# Altium footprint library 我的器件.PCBLIB: 450 footprints (part 21 of 29)
Each footprint in its own frame and in the unit in brackets; x right, y up, seen from the top. Pads: shape width x height; smd on the part's side, far side on the other; paste and mask are expansions set on the pad; w line width, h text height; cw(c..) or ccw(c..) is an arc to the next point about the centre after c.
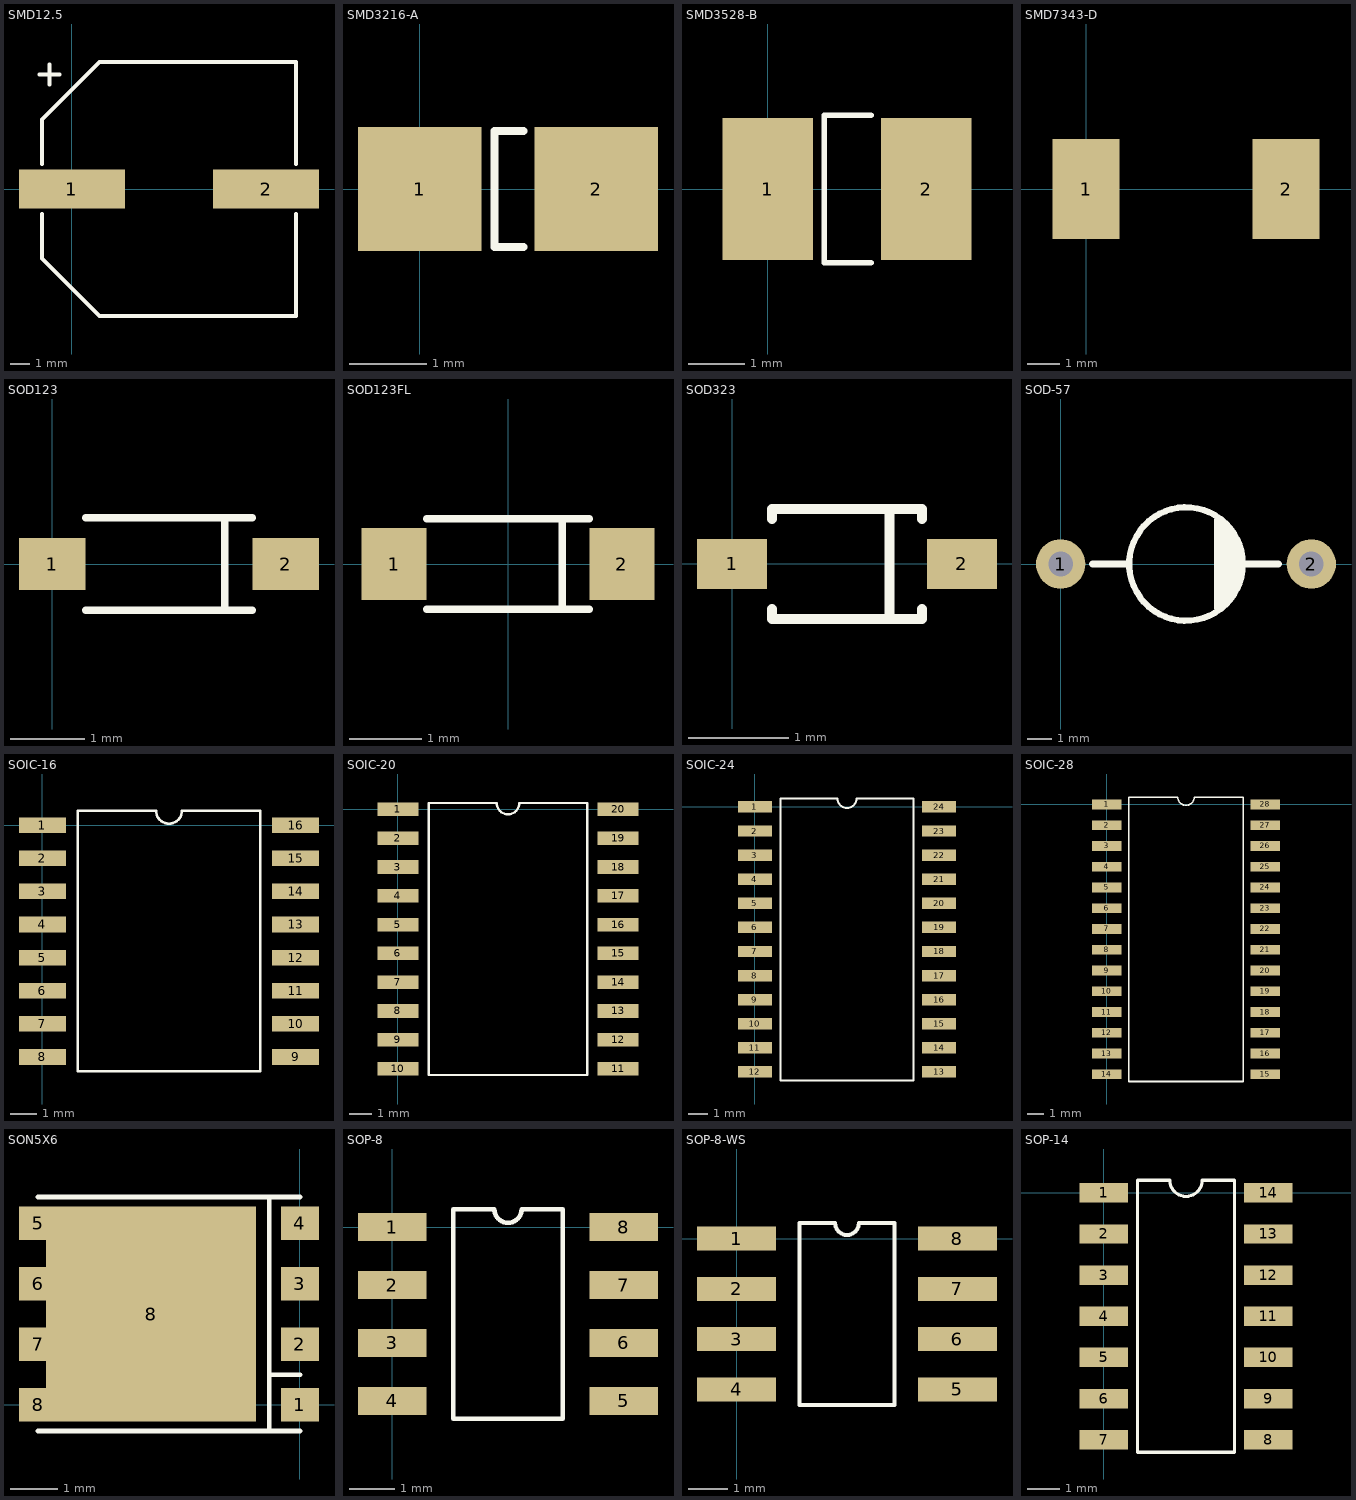
[diagram p20: the footprints below, top view; thin cyan lines are the x and y axes]

## SMD12.5 [mm]
height 13.5
pads (2):
  rect 5.4x2 smd: 1(0,0) 2(9.906,0)
Top Overlay:
  lines w0.2: -1.651,5.842 -0.635,5.842 ; -1.524,-1.27 -1.524,-3.556 1.397,-6.477 11.43,-6.477 11.43,-1.27 ; -1.524,1.27 -1.524,3.556 1.397,6.477 11.43,6.477 11.43,1.27 ; -1.143,5.334 -1.143,6.35

## SMD3216-A [mm]
pads (2):
  rect 1.6x1.6 smd: 1(0,0) 2(2.286,0)
Top Overlay:
  lines w0.1: 1.343,-0.75 0.968,-0.75 0.968,0.75 1.343,0.75
3D body: height 0.9, standoff 0, extent 2.736,-0.7 2.836,0.7
3D body: height 1.61, standoff 1.6, extent -0.357,-1 0.143,1
3D body: height 1.6, standoff 0, extent -0.457,-1 2.743,1
3D body: height 0.9, standoff 0, extent -0.55,-0.7 -0.45,0.7

## SMD3528-B [mm]
height 1.5
pads (2):
  rect 1.6x2.5 smd: 1(0,0) 2(2.8,0)
Top Overlay:
  lines w0.1: 1.825,-1.3 1,-1.3 1,1.3 1.825,1.3
3D body: height 1.2, standoff 0, extent 3.25,-1.2 3.35,1.2
3D body: height 1.2, standoff 0, extent -0.55,-1.2 -0.45,1.2
3D body: height 2, standoff 0, extent -0.45,-1.5 3.25,1.5
3D body: height 2.01, standoff 2, extent -0.305,-1.5 0.305,1.5

## SMD7343-D [mil]
height 196.85
pads (2):
  rect 80x120 smd: 1(0,0) 2(240,0)
3D body: height 62.99, standoff 0, extent -31.5,-49.21 -23.62,49.21
3D body: height 118.11, standoff 0, extent -25.67,-86.61 265.67,86.61
3D body: height 118.5, standoff 118.11, extent -7.95,-86.61 27.48,86.61
3D body: height 62.99, standoff 0, extent 263.62,-49.21 271.5,49.21

## SOD123 [mm]
pads (2):
  rect 0.9x0.7 smd: 1(0,0) 2(3.15,0)
Top Overlay:
  lines w0.1: 0.45,-0.625 2.7,-0.625 ; 0.45,0.625 2.7,0.625 ; 2.325,-0.625 2.325,0.625
3D body: height 0.3, standoff 0, extent 2.775,-0.25 3.475,0.25
3D body: height 1.31, standoff 1.3, extent 2.6,-0.8 2.8,0.8
3D body: height 0.3, standoff 0, extent -0.325,-0.25 0.375,0.25
3D body: height 1.3, standoff 0.2, extent 0.175,-0.8 2.975,0.8

## SOD123FL [mm]
pads (2):
  rect 0.9x1 smd: 1(-1.575,0) 2(1.575,0)
Top Overlay:
  lines w0.1: -1.125,-0.625 1.125,-0.625 ; -1.125,0.625 1.125,0.625 ; 0.75,-0.625 0.75,0.625
3D body: height 0.3, standoff 0, extent 1.2,-0.45 1.9,0.45
3D body: height 1.31, standoff 1.3, extent 1.025,-0.8 1.225,0.8
3D body: height 0.3, standoff 0, extent -1.9,-0.45 -1.2,0.45
3D body: height 1.3, standoff 0.2, extent -1.4,-0.8 1.4,0.8

## SOD323 [mm]
pads (2):
  rect 0.7x0.5 smd: 1(0,0) 2(2.3,0)
Top Overlay:
  lines w0.1: 0.4,-0.45 0.4,-0.55 1.9,-0.55 1.9,-0.45 ; 0.4,0.45 0.4,0.55 1.9,0.55 1.9,0.45 ; 1.575,-0.55 1.575,0.55
3D body: height 0.7, standoff 0, extent 2.15,-0.15 2.3,0.15
3D body: height 0.15, standoff 0, extent 2.3,-0.15 2.55,0.15
3D body: height 0.7, standoff 0.55, extent 1.925,-0.15 2.15,0.15
3D body: height 0.7, standoff 0.55, extent 0.15,-0.15 0.375,0.15
3D body: height 1, standoff 0.2, extent 0.3,-0.65 2,0.65
3D body: height 1.01, standoff 1, extent 1.45,-0.65 2,0.65
3D body: height 0.15, standoff 0, extent -0.25,-0.15 0,0.15
3D body: height 0.7, standoff 0, extent 0,-0.15 0.15,0.15

## SOD-57 [mm]
pads (2):
  round 2 hole 1: 1(0,0) 2(10.16,0)
Top Overlay:
  circle w0.254: c5.08,0 r2.3
  lines w0.254: 6.35,-1.778 6.35,1.778
  lines w0.3: 1.295,0 2.718,0 ; 6.629,1.626 6.604,1.6 6.604,-1.524 6.502,-1.626 6.502,-1.499 6.858,-1.143 6.858,1.321 ; 6.858,0.965 6.934,0.965 7.137,0.762 7.137,-0.965 ; 7.188,0 8.814,0

## SOIC-16 [mm] "Wide body"
height 4
pads (16):
  rect 1.8x0.6 smd: 1(0,0) 2(0,-1.27) 3(0,-2.54) 4(0,-3.81) 5(0,-5.08) 6(0,-6.35) 7(0,-7.62) 8(0,-8.89) 9(9.703,-8.89) 10(9.703,-7.62) 11(9.703,-6.35) 12(9.703,-5.08) 13(9.703,-3.81) 14(9.703,-2.54) 15(9.703,-1.27) 16(9.703,0)
Top Overlay:
  lines w0.1: 1.351,-9.445 1.351,0.555 4.351,0.555 ccw(c4.851,0.555) 4.851,0.055 ccw(c4.851,0.555) 5.351,0.555 8.351,0.555 8.351,-9.445 1.351,-9.445
3D body: height 0.2, standoff 0, extent 9.289,-0.279 10.051,0.279
3D body: height 1.3, standoff 0, extent 9.111,-0.279 9.289,0.279
3D body: height 1.3, standoff 1, extent 8.603,-0.279 9.111,0.279
3D body: height 0.2, standoff 0, extent 9.289,-1.549 10.051,-0.991
3D body: height 1.3, standoff 0, extent 9.111,-1.549 9.289,-0.991
3D body: height 1.3, standoff 1, extent 8.603,-1.549 9.111,-0.991
3D body: height 0.2, standoff 0, extent 9.289,-2.819 10.051,-2.261
3D body: height 1.3, standoff 0, extent 9.111,-2.819 9.289,-2.261
3D body: height 1.3, standoff 1, extent 8.603,-2.819 9.111,-2.261
3D body: height 0.2, standoff 0, extent 9.289,-4.089 10.051,-3.531
3D body: height 1.3, standoff 0, extent 9.111,-4.089 9.289,-3.531
3D body: height 1.3, standoff 1, extent 8.603,-4.089 9.111,-3.531
3D body: height 0.2, standoff 0, extent 9.289,-5.359 10.051,-4.801
3D body: height 1.3, standoff 0, extent 9.111,-5.359 9.289,-4.801
3D body: height 1.3, standoff 1, extent 8.603,-5.359 9.111,-4.801
3D body: height 0.2, standoff 0, extent 9.289,-6.629 10.051,-6.071
3D body: height 1.3, standoff 0, extent 9.111,-6.629 9.289,-6.071
3D body: height 1.3, standoff 1, extent 8.603,-6.629 9.111,-6.071
3D body: height 0.2, standoff 0, extent 9.289,-7.899 10.051,-7.341
3D body: height 1.3, standoff 0, extent 9.111,-7.899 9.289,-7.341
3D body: height 1.3, standoff 1, extent 8.603,-7.899 9.111,-7.341
3D body: height 0.2, standoff 0, extent 9.289,-9.169 10.051,-8.611
3D body: height 1.3, standoff 0, extent 9.111,-9.169 9.289,-8.611
3D body: height 1.3, standoff 1, extent 8.603,-9.169 9.111,-8.611
3D body: height 0.2, standoff 0, extent -0.348,-9.169 0.414,-8.611
3D body: height 1.3, standoff 0, extent 0.414,-9.169 0.592,-8.611
3D body: height 1.3, standoff 1, extent 0.592,-9.169 1.1,-8.611
3D body: height 0.2, standoff 0, extent -0.348,-7.899 0.414,-7.341
3D body: height 1.3, standoff 0, extent 0.414,-7.899 0.592,-7.341
3D body: height 1.3, standoff 1, extent 0.592,-7.899 1.1,-7.341
3D body: height 0.2, standoff 0, extent -0.348,-6.629 0.414,-6.071
3D body: height 1.3, standoff 0, extent 0.414,-6.629 0.592,-6.071
3D body: height 1.3, standoff 1, extent 0.592,-6.629 1.1,-6.071
3D body: height 0.2, standoff 0, extent -0.348,-5.359 0.414,-4.801
3D body: height 1.3, standoff 0, extent 0.414,-5.359 0.592,-4.801
3D body: height 1.3, standoff 1, extent 0.592,-5.359 1.1,-4.801
3D body: height 0.2, standoff 0, extent -0.348,-4.089 0.414,-3.531
3D body: height 1.3, standoff 0, extent 0.414,-4.089 0.592,-3.531
3D body: height 1.3, standoff 1, extent 0.592,-4.089 1.1,-3.531
3D body: height 0.2, standoff 0, extent -0.348,-2.819 0.414,-2.261
3D body: height 1.3, standoff 0, extent 0.414,-2.819 0.592,-2.261
3D body: height 1.3, standoff 1, extent 0.592,-2.819 1.1,-2.261
3D body: height 0.2, standoff 0, extent -0.348,-1.549 0.414,-0.991
3D body: height 1.3, standoff 0, extent 0.414,-1.549 0.592,-0.991
3D body: height 1.3, standoff 1, extent 0.592,-1.549 1.1,-0.991
3D body: height 2.41, standoff 0, extent 1.702,-1 2.698,-0.002
3D body: height 1.3, standoff 1, extent 0.592,-0.279 1.1,0.279
3D body: height 1.3, standoff 0, extent 0.414,-0.279 0.592,0.279
3D body: height 0.2, standoff 0, extent -0.348,-0.279 0.414,0.279
3D body: height 2.4, standoff 0.1, extent 1.101,-9.695 8.601,0.805

## SOIC-20 [mm]
pads (20):
  rect 1.8x0.6 smd: 1(0,0) 2(0,-1.27) 3(0,-2.54) 4(0,-3.81) 5(0,-5.08) 6(0,-6.35) 7(0,-7.62) 8(0,-8.89) 9(0,-10.16) 10(0,-11.43) 11(9.703,-11.43) 12(9.703,-10.16) 13(9.703,-8.89) 14(9.703,-7.62) 15(9.703,-6.35) 16(9.703,-5.08) 17(9.703,-3.81) 18(9.703,-2.54) 19(9.703,-1.27) 20(9.703,0)
Top Overlay:
  lines w0.1: 4.351,0.285 ccw(c4.851,0.285) 4.851,-0.215 ccw(c4.851,0.285) 5.351,0.285 ; 4.351,0.285 4.351,0.285 ; 4.351,0.285 1.351,0.285 1.351,-11.715 8.351,-11.715 8.351,0.285 ; 5.351,0.285 ccw(c5.351,0.285) 5.351,0.285 ; 5.351,0.285 8.351,0.285 ; 8.351,0.285 ccw(c8.351,0.285) 8.351,0.285
3D body: height 1.3, standoff 1, extent 8.603,-0.279 9.111,0.279
3D body: height 1.3, standoff 0, extent 9.111,-0.279 9.289,0.279
3D body: height 0.2, standoff 0, extent 9.289,-0.279 10.051,0.279
3D body: height 0.2, standoff 0, extent 9.289,-1.549 10.051,-0.991
3D body: height 1.3, standoff 0, extent 9.111,-1.549 9.289,-0.991
3D body: height 1.3, standoff 1, extent 8.603,-1.549 9.111,-0.991
3D body: height 0.2, standoff 0, extent 9.289,-2.819 10.051,-2.261
3D body: height 1.3, standoff 0, extent 9.111,-2.819 9.289,-2.261
3D body: height 1.3, standoff 1, extent 8.603,-2.819 9.111,-2.261
3D body: height 0.2, standoff 0, extent 9.289,-4.089 10.051,-3.531
3D body: height 1.3, standoff 0, extent 9.111,-4.089 9.289,-3.531
3D body: height 1.3, standoff 1, extent 8.603,-4.089 9.111,-3.531
3D body: height 0.2, standoff 0, extent 9.289,-5.359 10.051,-4.801
3D body: height 1.3, standoff 0, extent 9.111,-5.359 9.289,-4.801
3D body: height 1.3, standoff 1, extent 8.603,-5.359 9.111,-4.801
3D body: height 0.2, standoff 0, extent 9.289,-6.629 10.051,-6.071
3D body: height 1.3, standoff 0, extent 9.111,-6.629 9.289,-6.071
3D body: height 1.3, standoff 1, extent 8.603,-6.629 9.111,-6.071
3D body: height 0.2, standoff 0, extent 9.289,-7.899 10.051,-7.341
3D body: height 1.3, standoff 0, extent 9.111,-7.899 9.289,-7.341
3D body: height 1.3, standoff 1, extent 8.603,-7.899 9.111,-7.341
3D body: height 0.2, standoff 0, extent 9.289,-9.169 10.051,-8.611
3D body: height 1.3, standoff 0, extent 9.111,-9.169 9.289,-8.611
3D body: height 1.3, standoff 1, extent 8.603,-9.169 9.111,-8.611
3D body: height 0.2, standoff 0, extent 9.289,-10.439 10.051,-9.881
3D body: height 1.3, standoff 0, extent 9.111,-10.439 9.289,-9.881
3D body: height 1.3, standoff 1, extent 8.603,-10.439 9.111,-9.881
3D body: height 0.2, standoff 0, extent 9.289,-11.709 10.051,-11.151
3D body: height 1.3, standoff 0, extent 9.111,-11.709 9.289,-11.151
3D body: height 1.3, standoff 1, extent 8.603,-11.709 9.111,-11.151
3D body: height 1.3, standoff 1, extent 0.592,-11.709 1.1,-11.151
3D body: height 1.3, standoff 0, extent 0.414,-11.709 0.592,-11.151
3D body: height 0.2, standoff 0, extent -0.348,-11.709 0.414,-11.151
3D body: height 1.3, standoff 1, extent 0.592,-10.439 1.1,-9.881
3D body: height 1.3, standoff 0, extent 0.414,-10.439 0.592,-9.881
3D body: height 0.2, standoff 0, extent -0.348,-10.439 0.414,-9.881
3D body: height 1.3, standoff 1, extent 0.592,-9.169 1.1,-8.611
3D body: height 1.3, standoff 0, extent 0.414,-9.169 0.592,-8.611
3D body: height 0.2, standoff 0, extent -0.348,-9.169 0.414,-8.611
3D body: height 1.3, standoff 1, extent 0.592,-7.899 1.1,-7.341
3D body: height 1.3, standoff 0, extent 0.414,-7.899 0.592,-7.341
3D body: height 0.2, standoff 0, extent -0.348,-7.899 0.414,-7.341
3D body: height 1.3, standoff 1, extent 0.592,-6.629 1.1,-6.071
3D body: height 1.3, standoff 0, extent 0.414,-6.629 0.592,-6.071
3D body: height 0.2, standoff 0, extent -0.348,-6.629 0.414,-6.071
3D body: height 1.3, standoff 1, extent 0.592,-5.359 1.1,-4.801
3D body: height 1.3, standoff 0, extent 0.414,-5.359 0.592,-4.801
3D body: height 0.2, standoff 0, extent -0.348,-5.359 0.414,-4.801
3D body: height 1.3, standoff 1, extent 0.592,-4.089 1.1,-3.531
3D body: height 1.3, standoff 0, extent 0.414,-4.089 0.592,-3.531
3D body: height 0.2, standoff 0, extent -0.348,-4.089 0.414,-3.531
3D body: height 1.3, standoff 1, extent 0.592,-2.819 1.1,-2.261
3D body: height 1.3, standoff 0, extent 0.414,-2.819 0.592,-2.261
3D body: height 0.2, standoff 0, extent -0.348,-2.819 0.414,-2.261
3D body: height 1.3, standoff 1, extent 0.592,-1.549 1.1,-0.991
3D body: height 1.3, standoff 0, extent 0.414,-1.549 0.592,-0.991
3D body: height 0.2, standoff 0, extent -0.348,-1.549 0.414,-0.991
3D body: height 0.2, standoff 0, extent -0.348,-0.279 0.414,0.279
3D body: height 1.3, standoff 0, extent 0.414,-0.279 0.592,0.279
3D body: height 1.3, standoff 1, extent 0.592,-0.279 1.1,0.279
3D body: height 2.51, standoff 0, extent 1.669,-1 2.665,-0.002
3D body: height 2.5, standoff 0.2, extent 1.101,-12.115 8.601,0.685

## SOIC-24 [mm]
height 2
pads (24):
  rect 1.8x0.6 smd: 1(0,0) 2(0,-1.27) 3(0,-2.54) 4(0,-3.81) 5(0,-5.08) 6(0,-6.35) 7(0,-7.62) 8(0,-8.89) 9(0,-10.16) 10(0,-11.43) 11(0,-12.7) 12(0,-13.97) 13(9.703,-13.97) 14(9.703,-12.7) 15(9.703,-11.43) 16(9.703,-10.16) 17(9.703,-8.89) 18(9.703,-7.62) 19(9.703,-6.35) 20(9.703,-5.08) 21(9.703,-3.81) 22(9.703,-2.54) 23(9.703,-1.27) 24(9.703,0)
Top Overlay:
  lines w0.1: 1.351,-14.415 8.351,-14.415 8.351,0.445 5.351,0.445 cw(c4.851,0.445) 4.851,-0.055 cw(c4.851,0.445) 4.351,0.445 1.351,0.445 1.351,-14.415
3D body: height 1.3, standoff 1, extent 8.603,-0.279 9.111,0.279
3D body: height 1.3, standoff 0, extent 9.111,-0.279 9.289,0.279
3D body: height 0.2, standoff 0, extent 9.289,-0.279 10.051,0.279
3D body: height 1.3, standoff 1, extent 8.603,-1.549 9.111,-0.991
3D body: height 1.3, standoff 0, extent 9.111,-1.549 9.289,-0.991
3D body: height 0.2, standoff 0, extent 9.289,-1.549 10.051,-0.991
3D body: height 1.3, standoff 1, extent 8.603,-2.819 9.111,-2.261
3D body: height 1.3, standoff 0, extent 9.111,-2.819 9.289,-2.261
3D body: height 0.2, standoff 0, extent 9.289,-2.819 10.051,-2.261
3D body: height 1.3, standoff 1, extent 8.603,-4.089 9.111,-3.531
3D body: height 1.3, standoff 0, extent 9.111,-4.089 9.289,-3.531
3D body: height 0.2, standoff 0, extent 9.289,-4.089 10.051,-3.531
3D body: height 1.3, standoff 1, extent 8.603,-5.359 9.111,-4.801
3D body: height 1.3, standoff 0, extent 9.111,-5.359 9.289,-4.801
3D body: height 0.2, standoff 0, extent 9.289,-5.359 10.051,-4.801
3D body: height 1.3, standoff 1, extent 8.603,-6.629 9.111,-6.071
3D body: height 1.3, standoff 0, extent 9.111,-6.629 9.289,-6.071
3D body: height 0.2, standoff 0, extent 9.289,-6.629 10.051,-6.071
3D body: height 1.3, standoff 1, extent 8.603,-7.899 9.111,-7.341
3D body: height 1.3, standoff 0, extent 9.111,-7.899 9.289,-7.341
3D body: height 0.2, standoff 0, extent 9.289,-7.899 10.051,-7.341
3D body: height 1.3, standoff 1, extent 8.603,-9.169 9.111,-8.611
3D body: height 1.3, standoff 0, extent 9.111,-9.169 9.289,-8.611
3D body: height 0.2, standoff 0, extent 9.289,-9.169 10.051,-8.611
3D body: height 1.3, standoff 1, extent 8.603,-10.439 9.111,-9.881
3D body: height 1.3, standoff 0, extent 9.111,-10.439 9.289,-9.881
3D body: height 0.2, standoff 0, extent 9.289,-10.439 10.051,-9.881
3D body: height 1.3, standoff 1, extent 8.603,-11.709 9.111,-11.151
3D body: height 1.3, standoff 0, extent 9.111,-11.709 9.289,-11.151
3D body: height 0.2, standoff 0, extent 9.289,-11.709 10.051,-11.151
3D body: height 1.3, standoff 1, extent 8.603,-12.979 9.111,-12.421
3D body: height 1.3, standoff 0, extent 9.111,-12.979 9.289,-12.421
3D body: height 0.2, standoff 0, extent 9.289,-12.979 10.051,-12.421
3D body: height 1.3, standoff 1, extent 0.592,-0.279 1.1,0.279
3D body: height 1.3, standoff 0, extent 0.414,-0.279 0.592,0.279
3D body: height 0.2, standoff 0, extent -0.348,-0.279 0.414,0.279
3D body: height 2.4, standoff 0.1, extent 1.101,-14.785 8.601,0.815
3D body: height 2.41, standoff 0, extent 1.702,-1 2.698,-0.002
3D body: height 0.2, standoff 0, extent -0.348,-1.549 0.414,-0.991
3D body: height 1.3, standoff 0, extent 0.414,-1.549 0.592,-0.991
3D body: height 1.3, standoff 1, extent 0.592,-1.549 1.1,-0.991
3D body: height 0.2, standoff 0, extent -0.348,-2.819 0.414,-2.261
3D body: height 1.3, standoff 0, extent 0.414,-2.819 0.592,-2.261
3D body: height 1.3, standoff 1, extent 0.592,-2.819 1.1,-2.261
3D body: height 0.2, standoff 0, extent -0.348,-4.089 0.414,-3.531
3D body: height 1.3, standoff 0, extent 0.414,-4.089 0.592,-3.531
3D body: height 1.3, standoff 1, extent 0.592,-4.089 1.1,-3.531
3D body: height 0.2, standoff 0, extent -0.348,-5.359 0.414,-4.801
3D body: height 1.3, standoff 0, extent 0.414,-5.359 0.592,-4.801
3D body: height 1.3, standoff 1, extent 0.592,-5.359 1.1,-4.801
3D body: height 0.2, standoff 0, extent -0.348,-6.629 0.414,-6.071
3D body: height 1.3, standoff 0, extent 0.414,-6.629 0.592,-6.071
3D body: height 1.3, standoff 1, extent 0.592,-6.629 1.1,-6.071
3D body: height 0.2, standoff 0, extent -0.348,-7.899 0.414,-7.341
3D body: height 1.3, standoff 0, extent 0.414,-7.899 0.592,-7.341
3D body: height 1.3, standoff 1, extent 0.592,-7.899 1.1,-7.341
3D body: height 0.2, standoff 0, extent -0.348,-9.169 0.414,-8.611
3D body: height 1.3, standoff 0, extent 0.414,-9.169 0.592,-8.611
3D body: height 1.3, standoff 1, extent 0.592,-9.169 1.1,-8.611
3D body: height 0.2, standoff 0, extent -0.348,-10.439 0.414,-9.881
3D body: height 1.3, standoff 0, extent 0.414,-10.439 0.592,-9.881
3D body: height 1.3, standoff 1, extent 0.592,-10.439 1.1,-9.881
3D body: height 0.2, standoff 0, extent -0.348,-11.709 0.414,-11.151
3D body: height 1.3, standoff 0, extent 0.414,-11.709 0.592,-11.151
3D body: height 1.3, standoff 1, extent 0.592,-11.709 1.1,-11.151
3D body: height 0.2, standoff 0, extent -0.348,-12.979 0.414,-12.421
3D body: height 1.3, standoff 0, extent 0.414,-12.979 0.592,-12.421
3D body: height 1.3, standoff 1, extent 0.592,-12.979 1.1,-12.421
3D body: height 0.2, standoff 0, extent -0.348,-14.249 0.414,-13.691
3D body: height 1.3, standoff 0, extent 0.414,-14.249 0.592,-13.691
3D body: height 1.3, standoff 1, extent 0.592,-14.249 1.1,-13.691
3D body: height 0.2, standoff 0, extent 9.289,-14.249 10.051,-13.691
3D body: height 1.3, standoff 0, extent 9.111,-14.249 9.289,-13.691
3D body: height 1.3, standoff 1, extent 8.603,-14.249 9.111,-13.691

## SOIC-28 [mm]
height 2
pads (28):
  rect 1.8x0.6 smd: 1(0,0) 2(0,-1.27) 3(0,-2.54) 4(0,-3.81) 5(0,-5.08) 6(0,-6.35) 7(0,-7.62) 8(0,-8.89) 9(0,-10.16) 10(0,-11.43) 11(0,-12.7) 12(0,-13.97) 13(0,-15.24) 14(0,-16.51) 15(9.703,-16.51) 16(9.703,-15.24) 17(9.703,-13.97) 18(9.703,-12.7) 19(9.703,-11.43) 20(9.703,-10.16) 21(9.703,-8.89) 22(9.703,-7.62) 23(9.703,-6.35) 24(9.703,-5.08) 25(9.703,-3.81) 26(9.703,-2.54) 27(9.703,-1.27) 28(9.703,0)
Top Overlay:
  lines w0.1: 1.351,-16.955 1.351,0.445 4.351,0.445 ccw(c4.851,0.445) 4.851,-0.055 ccw(c4.851,0.445) 5.351,0.445 8.351,0.445 8.351,-16.955 1.351,-16.955
3D body: height 1.3, standoff 1, extent 8.603,-14.249 9.111,-13.691
3D body: height 1.3, standoff 0, extent 9.111,-14.249 9.289,-13.691
3D body: height 0.2, standoff 0, extent 9.289,-14.249 10.051,-13.691
3D body: height 1.3, standoff 1, extent 8.603,-15.519 9.111,-14.961
3D body: height 1.3, standoff 0, extent 9.111,-15.519 9.289,-14.961
3D body: height 0.2, standoff 0, extent 9.289,-15.519 10.051,-14.961
3D body: height 1.3, standoff 1, extent 8.603,-16.789 9.111,-16.231
3D body: height 1.3, standoff 0, extent 9.111,-16.789 9.289,-16.231
3D body: height 0.2, standoff 0, extent 9.289,-16.789 10.051,-16.231
3D body: height 1.3, standoff 1, extent 0.592,-16.789 1.1,-16.231
3D body: height 1.3, standoff 0, extent 0.414,-16.789 0.592,-16.231
3D body: height 0.2, standoff 0, extent -0.348,-16.789 0.414,-16.231
3D body: height 1.3, standoff 1, extent 0.592,-15.519 1.1,-14.961
3D body: height 1.3, standoff 0, extent 0.414,-15.519 0.592,-14.961
3D body: height 0.2, standoff 0, extent -0.348,-15.519 0.414,-14.961
3D body: height 1.3, standoff 1, extent 0.592,-14.249 1.1,-13.691
3D body: height 1.3, standoff 0, extent 0.414,-14.249 0.592,-13.691
3D body: height 0.2, standoff 0, extent -0.348,-14.249 0.414,-13.691
3D body: height 1.3, standoff 1, extent 0.592,-12.979 1.1,-12.421
3D body: height 1.3, standoff 0, extent 0.414,-12.979 0.592,-12.421
3D body: height 0.2, standoff 0, extent -0.348,-12.979 0.414,-12.421
3D body: height 1.3, standoff 1, extent 0.592,-11.709 1.1,-11.151
3D body: height 1.3, standoff 0, extent 0.414,-11.709 0.592,-11.151
3D body: height 0.2, standoff 0, extent -0.348,-11.709 0.414,-11.151
3D body: height 1.3, standoff 1, extent 0.592,-10.439 1.1,-9.881
3D body: height 1.3, standoff 0, extent 0.414,-10.439 0.592,-9.881
3D body: height 0.2, standoff 0, extent -0.348,-10.439 0.414,-9.881
3D body: height 1.3, standoff 1, extent 0.592,-9.169 1.1,-8.611
3D body: height 1.3, standoff 0, extent 0.414,-9.169 0.592,-8.611
3D body: height 0.2, standoff 0, extent -0.348,-9.169 0.414,-8.611
3D body: height 1.3, standoff 1, extent 0.592,-7.899 1.1,-7.341
3D body: height 1.3, standoff 0, extent 0.414,-7.899 0.592,-7.341
3D body: height 0.2, standoff 0, extent -0.348,-7.899 0.414,-7.341
3D body: height 1.3, standoff 1, extent 0.592,-6.629 1.1,-6.071
3D body: height 1.3, standoff 0, extent 0.414,-6.629 0.592,-6.071
3D body: height 0.2, standoff 0, extent -0.348,-6.629 0.414,-6.071
3D body: height 1.3, standoff 1, extent 0.592,-5.359 1.1,-4.801
3D body: height 1.3, standoff 0, extent 0.414,-5.359 0.592,-4.801
3D body: height 0.2, standoff 0, extent -0.348,-5.359 0.414,-4.801
3D body: height 1.3, standoff 1, extent 0.592,-4.089 1.1,-3.531
3D body: height 1.3, standoff 0, extent 0.414,-4.089 0.592,-3.531
3D body: height 0.2, standoff 0, extent -0.348,-4.089 0.414,-3.531
3D body: height 1.3, standoff 1, extent 0.592,-2.819 1.1,-2.261
3D body: height 1.3, standoff 0, extent 0.414,-2.819 0.592,-2.261
3D body: height 0.2, standoff 0, extent -0.348,-2.819 0.414,-2.261
3D body: height 1.3, standoff 1, extent 0.592,-1.549 1.1,-0.991
3D body: height 1.3, standoff 0, extent 0.414,-1.549 0.592,-0.991
3D body: height 0.2, standoff 0, extent -0.348,-1.549 0.414,-0.991
3D body: height 2.41, standoff 0, extent 1.702,-1 2.698,-0.002
3D body: height 2.4, standoff 0.1, extent 1.1,-17.3 8.601,0.805
3D body: height 0.2, standoff 0, extent -0.348,-0.279 0.414,0.279
3D body: height 1.3, standoff 0, extent 0.414,-0.279 0.592,0.279
3D body: height 1.3, standoff 1, extent 0.592,-0.279 1.1,0.279
3D body: height 0.2, standoff 0, extent 9.289,-12.979 10.051,-12.421
3D body: height 1.3, standoff 0, extent 9.111,-12.979 9.289,-12.421
3D body: height 1.3, standoff 1, extent 8.603,-12.979 9.111,-12.421
3D body: height 0.2, standoff 0, extent 9.289,-11.709 10.051,-11.151
3D body: height 1.3, standoff 0, extent 9.111,-11.709 9.289,-11.151
3D body: height 1.3, standoff 1, extent 8.603,-11.709 9.111,-11.151
3D body: height 0.2, standoff 0, extent 9.289,-10.439 10.051,-9.881
3D body: height 1.3, standoff 0, extent 9.111,-10.439 9.289,-9.881
3D body: height 1.3, standoff 1, extent 8.603,-10.439 9.111,-9.881
3D body: height 0.2, standoff 0, extent 9.289,-9.169 10.051,-8.611
3D body: height 1.3, standoff 0, extent 9.111,-9.169 9.289,-8.611
3D body: height 1.3, standoff 1, extent 8.603,-9.169 9.111,-8.611
3D body: height 0.2, standoff 0, extent 9.289,-7.899 10.051,-7.341
3D body: height 1.3, standoff 0, extent 9.111,-7.899 9.289,-7.341
3D body: height 1.3, standoff 1, extent 8.603,-7.899 9.111,-7.341
3D body: height 0.2, standoff 0, extent 9.289,-6.629 10.051,-6.071
3D body: height 1.3, standoff 0, extent 9.111,-6.629 9.289,-6.071
3D body: height 1.3, standoff 1, extent 8.603,-6.629 9.111,-6.071
3D body: height 0.2, standoff 0, extent 9.289,-5.359 10.051,-4.801
3D body: height 1.3, standoff 0, extent 9.111,-5.359 9.289,-4.801
3D body: height 1.3, standoff 1, extent 8.603,-5.359 9.111,-4.801
3D body: height 0.2, standoff 0, extent 9.289,-4.089 10.051,-3.531
3D body: height 1.3, standoff 0, extent 9.111,-4.089 9.289,-3.531
3D body: height 1.3, standoff 1, extent 8.603,-4.089 9.111,-3.531
3D body: height 0.2, standoff 0, extent 9.289,-2.819 10.051,-2.261
3D body: height 1.3, standoff 0, extent 9.111,-2.819 9.289,-2.261
3D body: height 1.3, standoff 1, extent 8.603,-2.819 9.111,-2.261
3D body: height 0.2, standoff 0, extent 9.289,-1.549 10.051,-0.991
3D body: height 1.3, standoff 0, extent 9.111,-1.549 9.289,-0.991
3D body: height 1.3, standoff 1, extent 8.603,-1.549 9.111,-0.991
3D body: height 0.2, standoff 0, extent 9.289,-0.279 10.051,0.279
3D body: height 1.3, standoff 0, extent 9.111,-0.279 9.289,0.279
3D body: height 1.3, standoff 1, extent 8.603,-0.279 9.111,0.279

## SON5X6 [mm]
pads (9):
  rect 0.8x0.7 smd: 1(0,0) 2(0,1.27) 3(0,2.54) 4(0,3.81) 5(-5.487,3.81) 6(-5.487,2.54) 7(-5.487,1.27) 8(-5.487,0)
  rect 4.4x4.5 smd: 8(-3.119,1.905)
Top Overlay:
  lines w0.1: -5.494,-0.545 0.006,-0.545 ; -5.494,4.355 0.006,4.355 ; -0.644,-0.545 -0.644,4.355 ; -0.644,0.63 0.006,0.63
3D body: height 1.11, standoff 1.1, extent -1,-0.3 -0.4,0.3
3D body: height 0.25, standoff 0, extent -5.741,-0.592 -1.441,4.408
3D body: height 0.25, standoff 0, extent -0.441,3.613 0.259,4.013
3D body: height 0.25, standoff 0, extent -0.441,2.343 0.259,2.743
3D body: height 0.25, standoff 0, extent -0.441,1.073 0.259,1.473
3D body: height 0.25, standoff 0, extent -0.441,-0.197 0.259,0.203
3D body: height 1.1, standoff 0.01, extent -5.644,-0.595 0.156,4.405

## SOP-8 [mm]
height 2
pads (8):
  rect 1.5x0.61 smd: 1(0,0) 2(0,-1.27) 3(0,-2.54) 4(0,-3.81) 5(5.08,-3.81) 6(5.08,-2.54) 7(5.08,-1.27) 8(5.08,0)
Top Overlay:
  lines w0.1: 1.34,-4.205 1.34,0.395 2.04,0.395 2.24,0.395 ccw(c2.54,0.395) 2.54,0.095 ccw(c2.54,0.395) 2.84,0.395 3.74,0.395 3.74,-4.205 1.34,-4.205
3D body: height 1.61, standoff 0.1, extent 0.975,-0.711 1.971,0.287
3D body: height 1.5, standoff 0.2, extent 0.54,-4.455 4.54,0.645
3D body: height 0.9, standoff 0.7, extent 4.53,-0.25 4.73,0.25
3D body: height 0.9, standoff 0, extent 4.73,-0.25 4.93,0.25
3D body: height 0.2, standoff 0, extent 4.93,-0.25 5.53,0.25
3D body: height 0.9, standoff 0.7, extent 4.53,-1.52 4.73,-1.02
3D body: height 0.9, standoff 0, extent 4.73,-1.52 4.93,-1.02
3D body: height 0.2, standoff 0, extent 4.93,-1.52 5.53,-1.02
3D body: height 0.9, standoff 0.7, extent 4.53,-2.79 4.73,-2.29
3D body: height 0.9, standoff 0, extent 4.73,-2.79 4.93,-2.29
3D body: height 0.2, standoff 0, extent 4.93,-2.79 5.53,-2.29
3D body: height 0.9, standoff 0.7, extent 4.53,-4.06 4.73,-3.56
3D body: height 0.9, standoff 0, extent 4.73,-4.06 4.93,-3.56
3D body: height 0.2, standoff 0, extent 4.93,-4.06 5.53,-3.56
3D body: height 0.9, standoff 0.7, extent 0.35,-4.06 0.55,-3.56
3D body: height 0.9, standoff 0, extent 0.15,-4.06 0.35,-3.56
3D body: height 0.2, standoff 0, extent -0.45,-4.06 0.15,-3.56
3D body: height 0.9, standoff 0.7, extent 0.35,-2.79 0.55,-2.29
3D body: height 0.9, standoff 0, extent 0.15,-2.79 0.35,-2.29
3D body: height 0.2, standoff 0, extent -0.45,-2.79 0.15,-2.29
3D body: height 0.9, standoff 0.7, extent 0.35,-1.52 0.55,-1.02
3D body: height 0.9, standoff 0, extent 0.15,-1.52 0.35,-1.02
3D body: height 0.2, standoff 0, extent -0.45,-1.52 0.15,-1.02
3D body: height 0.9, standoff 0.7, extent 0.35,-0.25 0.55,0.25
3D body: height 0.9, standoff 0, extent 0.15,-0.25 0.35,0.25
3D body: height 0.2, standoff 0, extent -0.45,-0.25 0.15,0.25

## SOP-8-WS [mil]
pads (8):
  rect 78.74x24 smd: 1(0,0) 2(0,-50) 3(0,-100) 4(0,-150) 5(220,-150) 6(220,-100) 7(220,-50) 8(220,0)
Top Overlay:
  lines w3.94: 62.76,-165.55 157.24,-165.55 157.24,15.55 121.81,15.55 cw(c110,15.55) 110,3.74 cw(c110,15.55) 98.19,15.55 90.32,15.55 62.76,15.55 62.76,-165.55
3D body: height 7.87, standoff 0, extent -7.72,-9.84 15.91,9.84
3D body: height 35.43, standoff 0, extent 15.91,-9.84 23.78,9.84
3D body: height 35.43, standoff 27.56, extent 23.78,-9.84 31.65,9.84
3D body: height 7.87, standoff 0, extent -7.72,-59.84 15.91,-40.16
3D body: height 35.43, standoff 0, extent 15.91,-59.84 23.78,-40.16
3D body: height 35.43, standoff 27.56, extent 23.78,-59.84 31.65,-40.16
3D body: height 7.87, standoff 0, extent -7.72,-109.84 15.91,-90.16
3D body: height 35.43, standoff 0, extent 15.91,-109.84 23.78,-90.16
3D body: height 35.43, standoff 27.56, extent 23.78,-109.84 31.65,-90.16
3D body: height 7.87, standoff 0, extent -7.72,-159.84 15.91,-140.16
3D body: height 35.43, standoff 0, extent 15.91,-159.84 23.78,-140.16
3D body: height 35.43, standoff 27.56, extent 23.78,-159.84 31.65,-140.16
3D body: height 7.87, standoff 0, extent 204.09,-159.84 227.72,-140.16
3D body: height 35.43, standoff 0, extent 196.22,-159.84 204.09,-140.16
3D body: height 35.43, standoff 27.56, extent 188.35,-159.84 196.22,-140.16
3D body: height 7.87, standoff 0, extent 204.09,-109.84 227.72,-90.16
3D body: height 35.43, standoff 0, extent 196.22,-109.84 204.09,-90.16
3D body: height 35.43, standoff 27.56, extent 188.35,-109.84 196.22,-90.16
3D body: height 7.87, standoff 0, extent 204.09,-59.84 227.72,-40.16
3D body: height 35.43, standoff 0, extent 196.22,-59.84 204.09,-40.16
3D body: height 35.43, standoff 27.56, extent 188.35,-59.84 196.22,-40.16
3D body: height 7.87, standoff 0, extent 204.09,-9.84 227.72,9.84
3D body: height 35.43, standoff 0, extent 196.22,-9.84 204.09,9.84
3D body: height 35.43, standoff 27.56, extent 188.35,-9.84 196.22,9.84
3D body: height 59.06, standoff 7.87, extent 31.26,-175.39 188.74,25.39
3D body: height 63.39, standoff 3.94, extent 48.39,-28 87.61,11.29

## SOP-14 [mm]
pads (14):
  rect 1.5x0.6 smd: 1(0,0) 2(0,-1.27) 3(0,-2.54) 4(0,-3.81) 5(0,-5.08) 6(0,-6.35) 7(0,-7.62) 8(5.08,-7.62) 9(5.08,-6.35) 10(5.08,-5.08) 11(5.08,-3.81) 12(5.08,-2.54) 13(5.08,-1.27) 14(5.08,0)
Top Overlay:
  lines w0.1: 1.04,-8.01 1.04,0.39 2.04,0.39 ccw(c2.54,0.39) 2.54,-0.11 ccw(c2.54,0.39) 3.04,0.39 4.04,0.39 4.04,-8.01 1.04,-8.01
3D body: height 0.2, standoff 0, extent 4.93,-0.25 5.53,0.25
3D body: height 0.9, standoff 0, extent 4.73,-0.25 4.93,0.25
3D body: height 0.9, standoff 0.7, extent 4.53,-0.25 4.73,0.25
3D body: height 0.2, standoff 0, extent 4.93,-1.52 5.53,-1.02
3D body: height 0.9, standoff 0, extent 4.73,-1.52 4.93,-1.02
3D body: height 0.9, standoff 0.7, extent 4.53,-1.52 4.73,-1.02
3D body: height 0.2, standoff 0, extent 4.93,-2.79 5.53,-2.29
3D body: height 0.9, standoff 0, extent 4.73,-2.79 4.93,-2.29
3D body: height 0.9, standoff 0.7, extent 4.53,-2.79 4.73,-2.29
3D body: height 0.2, standoff 0, extent 4.93,-4.06 5.53,-3.56
3D body: height 0.9, standoff 0, extent 4.73,-4.06 4.93,-3.56
3D body: height 0.9, standoff 0.7, extent 4.53,-4.06 4.73,-3.56
3D body: height 0.2, standoff 0, extent 4.93,-5.33 5.53,-4.83
3D body: height 0.9, standoff 0, extent 4.73,-5.33 4.93,-4.83
3D body: height 0.9, standoff 0.7, extent 4.53,-5.33 4.73,-4.83
3D body: height 0.2, standoff 0, extent 4.93,-6.6 5.53,-6.1
3D body: height 0.9, standoff 0, extent 4.73,-6.6 4.93,-6.1
3D body: height 0.9, standoff 0.7, extent 4.53,-6.6 4.73,-6.1
3D body: height 0.2, standoff 0, extent 4.93,-7.87 5.53,-7.37
3D body: height 0.9, standoff 0, extent 4.73,-7.87 4.93,-7.37
3D body: height 0.9, standoff 0.7, extent 4.53,-7.87 4.73,-7.37
3D body: height 0.2, standoff 0, extent -0.45,-7.87 0.15,-7.37
3D body: height 0.9, standoff 0, extent 0.15,-7.87 0.35,-7.37
3D body: height 0.9, standoff 0.7, extent 0.35,-7.87 0.55,-7.37
3D body: height 0.2, standoff 0, extent -0.45,-6.6 0.15,-6.1
3D body: height 0.9, standoff 0, extent 0.15,-6.6 0.35,-6.1
3D body: height 0.9, standoff 0.7, extent 0.35,-6.6 0.55,-6.1
3D body: height 0.2, standoff 0, extent -0.45,-5.33 0.15,-4.83
3D body: height 0.9, standoff 0, extent 0.15,-5.33 0.35,-4.83
3D body: height 0.9, standoff 0.7, extent 0.35,-5.33 0.55,-4.83
3D body: height 0.2, standoff 0, extent -0.45,-4.06 0.15,-3.56
3D body: height 0.9, standoff 0, extent 0.15,-4.06 0.35,-3.56
3D body: height 0.9, standoff 0.7, extent 0.35,-4.06 0.55,-3.56
3D body: height 0.2, standoff 0, extent -0.45,-2.79 0.15,-2.29
3D body: height 0.9, standoff 0, extent 0.15,-2.79 0.35,-2.29
3D body: height 0.9, standoff 0.7, extent 0.35,-2.79 0.55,-2.29
3D body: height 0.2, standoff 0, extent -0.45,-1.52 0.15,-1.02
3D body: height 0.9, standoff 0, extent 0.15,-1.52 0.35,-1.02
3D body: height 0.9, standoff 0.7, extent 0.35,-1.52 0.55,-1.02
3D body: height 0.9, standoff 0.7, extent 0.35,-0.25 0.55,0.25
3D body: height 0.9, standoff 0, extent 0.15,-0.25 0.35,0.25
3D body: height 0.2, standoff 0, extent -0.45,-0.25 0.15,0.25
3D body: height 1.61, standoff 0.1, extent 1.178,-0.726 2.174,0.272
3D body: height 1.5, standoff 0.2, extent 0.54,-8.31 4.54,0.69